# Altium footprint library rescap.PcbLib: 85 footprints (part 5 of 6)
Each footprint in its own frame and in the unit in brackets; x right, y up, seen from the top. Pads: shape width x height; smd on the part's side, far side on the other; paste and mask are expansions set on the pad; w line width, h text height; cw(c..) or ccw(c..) is an arc to the next point about the centre after c.
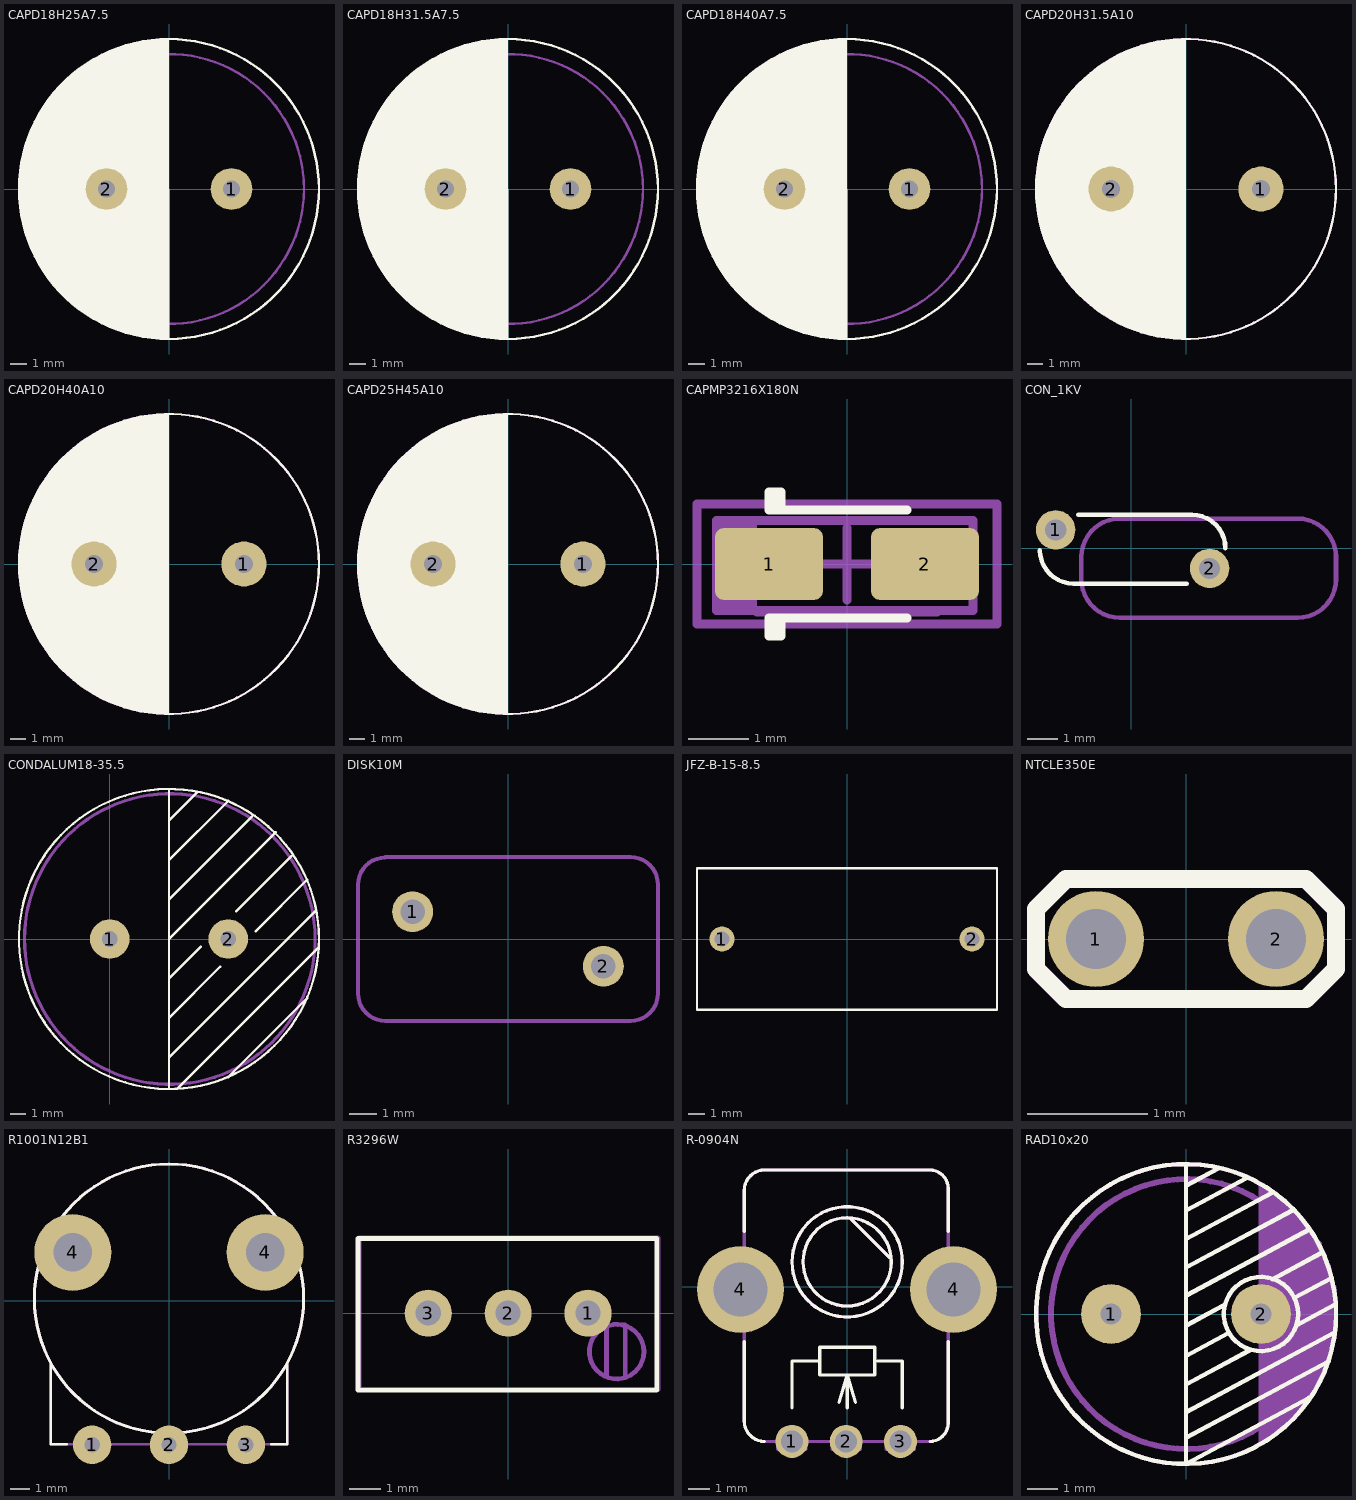
[diagram p4: the footprints below, top view; thin cyan lines are the x and y axes]

## CAPD18H25A7.5 [mm]
height 25
pads (2):
  round 2.5 hole 1: 1(3.75,0) 2(-3.75,0)
Top Overlay:
  circle w0.15: c0,0 r9
  pour cut-out: -3.75,-1.75 -3.922,-1.75 -4.26,-1.683 -4.579,-1.551 -4.866,-1.359 -5.109,-1.116 -5.301,-0.829 -5.433,-0.51 -5.5,-0.172 -5.5,0 -5.5,0.172 -5.433,0.51 -5.301,0.829 -5.109,1.116 -4.866,1.359 -4.579,1.551 -4.26,1.683 -3.922,1.75 -3.75,1.75 -3.578,1.75 -3.24,1.683 -2.921,1.551 -2.634,1.359 -2.391,1.116 -2.199,0.829 -2.067,0.51 -2,0.172 -2,0 -2,-0.172 -2.067,-0.51 -2.199,-0.829 -2.391,-1.116 -2.634,-1.359 -2.921,-1.551 -3.24,-1.683 -3.578,-1.75
  region: 0,-9 -0.442,-9 -1.322,-8.913 -2.189,-8.741 -3.036,-8.484 -3.853,-8.146 -4.633,-7.729 -5.368,-7.238 -6.051,-6.677 -6.677,-6.051 -7.238,-5.368 -7.729,-4.633 -8.146,-3.853 -8.484,-3.036 -8.741,-2.189 -8.913,-1.322 -9,-0.442 -9,0 -9,0.442 -8.913,1.322 -8.741,2.189 -8.484,3.036 -8.146,3.853 -7.729,4.632 -7.238,5.368 -6.677,6.051 -6.051,6.677 -5.368,7.238 -4.633,7.729 -3.853,8.146 -3.036,8.484 -2.189,8.741 -1.322,8.913 -0.442,9 0,9
Mechanical 29:
  circle w0.15: c0,0 r8.1
  lines w0.15: -3.7,-1 -3.7,0 -3.7,1
  text ".Designator" at -2.2,-0.4 h1
3D body: height 25, standoff 0, extent -9,-9 9,9

## CAPD18H31.5A7.5 [mm]
height 25
pads (2):
  round 2.5 hole 1: 1(3.75,0) 2(-3.75,0)
Top Overlay:
  circle w0.15: c0,0 r9
  pour cut-out: -3.75,-1.75 -3.922,-1.75 -4.26,-1.683 -4.579,-1.551 -4.866,-1.359 -5.109,-1.116 -5.301,-0.829 -5.433,-0.51 -5.5,-0.172 -5.5,0 -5.5,0.172 -5.433,0.51 -5.301,0.829 -5.109,1.116 -4.866,1.359 -4.579,1.551 -4.26,1.683 -3.922,1.75 -3.75,1.75 -3.578,1.75 -3.24,1.683 -2.921,1.551 -2.634,1.359 -2.391,1.116 -2.199,0.829 -2.067,0.51 -2,0.172 -2,0 -2,-0.172 -2.067,-0.51 -2.199,-0.829 -2.391,-1.116 -2.634,-1.359 -2.921,-1.551 -3.24,-1.683 -3.578,-1.75
  region: 0,-9 -0.442,-9 -1.322,-8.913 -2.189,-8.741 -3.036,-8.484 -3.853,-8.146 -4.633,-7.729 -5.368,-7.238 -6.051,-6.677 -6.677,-6.051 -7.238,-5.368 -7.729,-4.633 -8.146,-3.853 -8.484,-3.036 -8.741,-2.189 -8.913,-1.322 -9,-0.442 -9,0 -9,0.442 -8.913,1.322 -8.741,2.189 -8.484,3.036 -8.146,3.853 -7.729,4.632 -7.238,5.368 -6.677,6.051 -6.051,6.677 -5.368,7.238 -4.633,7.729 -3.853,8.146 -3.036,8.484 -2.189,8.741 -1.322,8.913 -0.442,9 0,9
Mechanical 29:
  circle w0.15: c0,0 r8.1
  lines w0.15: -3.7,-1 -3.7,0 -3.7,1
  text ".Designator" at -2.2,-0.4 h1
3D body: height 31.5, standoff 0, extent -9,-9 9,9

## CAPD18H40A7.5 [mm]
height 25
pads (2):
  round 2.5 hole 1: 1(3.75,0) 2(-3.75,0)
Top Overlay:
  circle w0.15: c0,0 r9
  pour cut-out: -3.75,-1.75 -3.922,-1.75 -4.26,-1.683 -4.579,-1.551 -4.866,-1.359 -5.109,-1.116 -5.301,-0.829 -5.433,-0.51 -5.5,-0.172 -5.5,0 -5.5,0.172 -5.433,0.51 -5.301,0.829 -5.109,1.116 -4.866,1.359 -4.579,1.551 -4.26,1.683 -3.922,1.75 -3.75,1.75 -3.578,1.75 -3.24,1.683 -2.921,1.551 -2.634,1.359 -2.391,1.116 -2.199,0.829 -2.067,0.51 -2,0.172 -2,0 -2,-0.172 -2.067,-0.51 -2.199,-0.829 -2.391,-1.116 -2.634,-1.359 -2.921,-1.551 -3.24,-1.683 -3.578,-1.75
  region: 0,-9 -0.442,-9 -1.322,-8.913 -2.189,-8.741 -3.036,-8.484 -3.853,-8.146 -4.633,-7.729 -5.368,-7.238 -6.051,-6.677 -6.677,-6.051 -7.238,-5.368 -7.729,-4.633 -8.146,-3.853 -8.484,-3.036 -8.741,-2.189 -8.913,-1.322 -9,-0.442 -9,0 -9,0.442 -8.913,1.322 -8.741,2.189 -8.484,3.036 -8.146,3.853 -7.729,4.632 -7.238,5.368 -6.677,6.051 -6.051,6.677 -5.368,7.238 -4.633,7.729 -3.853,8.146 -3.036,8.484 -2.189,8.741 -1.322,8.913 -0.442,9 0,9
Mechanical 29:
  circle w0.15: c0,0 r8.1
  lines w0.15: -3.7,-1 -3.7,0 -3.7,1
  text ".Designator" at -2.2,-0.4 h1
3D body: height 40, standoff 0, extent -9,-9 9,9

## CAPD20H31.5A10 [mm]
height 31.5
pads (2):
  round 3 hole 1.2: 1(5,0) 2(-5,0)
Top Overlay:
  circle w0.15: c0,0 r10
  pour cut-out: -5,-1.75 -5.172,-1.75 -5.51,-1.683 -5.829,-1.551 -6.116,-1.359 -6.359,-1.116 -6.551,-0.829 -6.683,-0.51 -6.75,-0.172 -6.75,0 -6.75,0.172 -6.683,0.51 -6.551,0.829 -6.359,1.116 -6.116,1.359 -5.829,1.551 -5.51,1.683 -5.172,1.75 -5,1.75 -4.828,1.75 -4.49,1.683 -4.171,1.551 -3.884,1.359 -3.641,1.116 -3.449,0.829 -3.317,0.51 -3.25,0.172 -3.25,0 -3.25,-0.172 -3.317,-0.51 -3.449,-0.829 -3.641,-1.116 -3.884,-1.359 -4.171,-1.551 -4.49,-1.683 -4.828,-1.75
  region: 0,-10 -0.491,-10 -1.469,-9.904 -2.433,-9.712 -3.373,-9.427 -4.281,-9.051 -5.147,-8.588 -5.964,-8.042 -6.724,-7.418 -7.418,-6.724 -8.042,-5.964 -8.588,-5.147 -9.051,-4.281 -9.427,-3.373 -9.712,-2.433 -9.904,-1.469 -10,-0.491 -10,0 -10,0.491 -9.904,1.469 -9.712,2.433 -9.427,3.373 -9.051,4.281 -8.588,5.147 -8.042,5.964 -7.418,6.724 -6.724,7.418 -5.964,8.042 -5.147,8.588 -4.281,9.051 -3.373,9.427 -2.433,9.712 -1.469,9.904 -0.491,10 0,10
Mechanical 29:
  circle w0.15: c0,0 r10.002
  lines w0.15: -6.1,-1 -6.1,0 -6.1,1
  text ".Designator" at -2.6,-0.4 h1
3D body: height 31.5, standoff 0, extent -10,-10 10,10

## CAPD20H40A10 [mm]
height 40
pads (2):
  round 3 hole 1.2: 1(5,0) 2(-5,0)
Top Overlay:
  circle w0.15: c0,0 r10
  region: 0,-10 -0.491,-10 -1.469,-9.904 -2.433,-9.712 -3.373,-9.427 -4.281,-9.051 -5.147,-8.588 -5.964,-8.042 -6.724,-7.418 -7.418,-6.724 -8.042,-5.964 -8.588,-5.147 -9.051,-4.281 -9.427,-3.373 -9.712,-2.433 -9.904,-1.469 -10,-0.491 -10,0 -10,0.491 -9.904,1.469 -9.712,2.433 -9.427,3.373 -9.051,4.281 -8.588,5.147 -8.042,5.964 -7.418,6.724 -6.724,7.418 -5.964,8.042 -5.147,8.588 -4.281,9.051 -3.373,9.427 -2.433,9.712 -1.469,9.904 -0.491,10 0,10
  pour cut-out: -5,-1.75 -5.172,-1.75 -5.51,-1.683 -5.829,-1.551 -6.116,-1.359 -6.359,-1.116 -6.551,-0.829 -6.683,-0.51 -6.75,-0.172 -6.75,0 -6.75,0.172 -6.683,0.51 -6.551,0.829 -6.359,1.116 -6.116,1.359 -5.829,1.551 -5.51,1.683 -5.172,1.75 -5,1.75 -4.828,1.75 -4.49,1.683 -4.171,1.551 -3.884,1.359 -3.641,1.116 -3.449,0.829 -3.317,0.51 -3.25,0.172 -3.25,0 -3.25,-0.172 -3.317,-0.51 -3.449,-0.829 -3.641,-1.116 -3.884,-1.359 -4.171,-1.551 -4.49,-1.683 -4.828,-1.75
Mechanical 29:
  circle w0.15: c0,0 r10.002
  lines w0.15: -6.1,-1 -6.1,0 -6.1,1
  text ".Designator" at -3.3,-0.5 h1
3D body: height 40, standoff 0, extent -10,-10 10,10

## CAPD25H45A10 [mm]
height 45
pads (2):
  round 3 hole 1.2: 1(5,0) 2(-5,0)
Top Overlay:
  circle w0.15: c0,0 r10
  pour cut-out: -5,-1.75 -5.172,-1.75 -5.51,-1.683 -5.829,-1.551 -6.116,-1.359 -6.359,-1.116 -6.551,-0.829 -6.683,-0.51 -6.75,-0.172 -6.75,0 -6.75,0.172 -6.683,0.51 -6.551,0.829 -6.359,1.116 -6.116,1.359 -5.829,1.551 -5.51,1.683 -5.172,1.75 -5,1.75 -4.828,1.75 -4.49,1.683 -4.171,1.551 -3.884,1.359 -3.641,1.116 -3.449,0.829 -3.317,0.51 -3.25,0.172 -3.25,0 -3.25,-0.172 -3.317,-0.51 -3.449,-0.829 -3.641,-1.116 -3.884,-1.359 -4.171,-1.551 -4.49,-1.683 -4.828,-1.75
  region: 0,-10 -0.491,-10 -1.469,-9.904 -2.433,-9.712 -3.373,-9.427 -4.281,-9.051 -5.147,-8.588 -5.964,-8.042 -6.724,-7.418 -7.418,-6.724 -8.042,-5.964 -8.588,-5.147 -9.051,-4.281 -9.427,-3.373 -9.712,-2.433 -9.904,-1.469 -10,-0.491 -10,0 -10,0.491 -9.904,1.469 -9.712,2.433 -9.427,3.373 -9.051,4.281 -8.588,5.147 -8.042,5.964 -7.418,6.724 -6.724,7.418 -5.964,8.042 -5.147,8.588 -4.281,9.051 -3.373,9.427 -2.433,9.712 -1.469,9.904 -0.491,10 0,10
Mechanical 29:
  circle w0.15: c0,0 r10.002
  lines w0.15: -6.1,-1 -6.1,0 -6.1,1
  text ".Designator" at -3.8,-0.3 h1
3D body: height 45, standoff 0, extent -10,-10 10,10

## CAPMP3216X180N [mm] "Capacitor, polarized, Molded Body, EIA 535BAAC size A; 3.20mm L X 1.60mm W X 1.80mm H"
height 1.8
pads (2):
  rrect25% 1.8x1.2 smd: 1(-1.3,0) 2(1.3,0)
Top Overlay:
  lines w0.15: -1.2,-1.2 -1.2,-0.9 ; -1.2,0.9 -1.2,1.2 ; -1.1,-0.9 -1.1,-1.2 -1.3,-1.2 -1.3,-0.9 1,-0.9 ; -1.1,0.9 -1.1,1.2 -1.3,1.2 -1.3,0.9 1,0.9
Top Courtyard:
  lines w0.15: -0.6,0 0,0 ; 0,-0.6 0,0 ; 0,0.6 0,0 ; 0.6,0 0,0 ; -2.5,-1 -2.5,1 2.5,1 2.5,-1 -2.5,-1
Mechanical 29:
  rectangle: -2.175,-0.775 -1.5,0.725
  lines w0.15: -1.5,-0.8 1.5,-0.8 ; -2.175,-0.775 2.1,-0.775 2.1,0.725 -2.175,0.725 -2.175,-0.775
  text ".Designator" at -1.4,-0.4 h1
3D body "CAPMP3216X180N.STEP": height 1.8, standoff 0, extent -1.6,-0.8 1.6,0.8

## CON_1KV [mm]
pads (2):
  round 1.3 hole 0.7: 1(-2.5,0.6) 2(2.58,-0.67)
Top Overlay:
  lines w0.15: -3.02,-0.07 ccw(c-1.92,-0.07) -1.92,-1.17 1.83,-1.17 ; -1.75,1.1 2,1.1 cw(c2,0) 3.1,0
Mechanical 29:
  lines w0.15: -1.65,-1.03 ccw(c-0.38,-1.03) -0.38,-2.3 -0.15,-2.3 5.48,-2.3 ccw(c5.48,-1.03) 6.75,-1.03 6.75,-0.295 ccw(c5.48,-0.295) 5.48,0.975 -0.38,0.975 ccw(c-0.38,-0.295) -1.65,-0.295 -1.65,-1.03
  text ".Designator" at -0.2,-0.9 h1
3D body "CAPS6mm.STEP": height 6.1, standoff -3, extent -2.775,-0.95 2.825,0.85

## CONDALUM18-35.5 [mm]
pads (2):
  round 2.5 hole 1: 1(0,0) 2(7.5,0)
Top Overlay:
  circle w0.15: c3.75,0 r9.5
  lines w0.15: 3.75,-9.5 3.75,9.5 ; 3.75,-7.5 13,1.75 ; 3.75,-5 7,-1.75 ; 3.75,-2.5 5.75,-0.5 ; 3.75,0 10.5,6.75 ; 3.75,2.5 9,7.75 ; 3.75,5 7.5,8.75 ; 3.75,7.5 5.5,9.25 ; 4.25,-9.5 13.25,-0.5 ; 7.5,-8.75 12.5,-3.75 ; 8,1.75 11.5,5.25 ; 9.25,0.5 12.5,3.75
Top Courtyard:
  circle w0.2: c3.8,0 r9.202
3D body "cap.STEP": height 35.55, standoff -3.1, extent -6.699,-10.41 14.202,10.448

## DISK10M [mm]
pads (2):
  round 1.5 hole 0.9: 1(-3.5,1) 2(3.5,-1)
Top Courtyard:
  lines w0.15: -5.5,-2 ccw(c-4.5,-2) -4.5,-3 4.5,-3 ccw(c4.5,-2) 5.5,-2 ; -5.5,-1.989 -5.5,2 ; -5.5,1.989 cw(c-4.5,1.989) -4.5,2.989 ; -4.5,3 4.5,3 cw(c4.5,2) 5.5,2 ; 5.5,-1.989 5.5,1.989

## JFZ-B-15-8.5 [mm]
pads (2):
  round 1.5 hole 0.9: 1(-7.5,0) 2(7.5,0)
Top Overlay:
  lines w0.15: -9,-4.25 -9,4.25 -7.5,4.25 7.5,4.25 9,4.25 9,-4.25 7.5,-4.25 -7.5,-4.25 -9,-4.25
3D body: height 14, standoff 0.5, extent -9,-4.3 9,4.2

## NTCLE350E [mm]
pads (2):
  round 0.8 hole 0.5: 1(-0.75,0) 2(0.75,0)
Top Overlay:
  lines w0.15: -1.25,-0.25 -1,-0.5 1,-0.5 1.25,-0.25 1.25,0.25 1,0.5 -1,0.5 -1.25,0.25 -1.25,-0.25
Top Courtyard:
  lines w0.15: -1.25,-0.25 -1,-0.5 1,-0.5 1.25,-0.25 1.25,0.25 1,0.5 -1,0.5 -1.25,0.25 -1.25,-0.25

## R1001N12B1 [mm]
pads (5):
  round 2 hole 0.8: 1(-4,-7.5) 2(0,-7.5) 3(4,-7.5)
  round 4 hole 2: 4(-5,2.5) 4(5,2.5)
Top Overlay:
  circle w0.15: c0,0.1 r7
  lines w0.15: -6.15,-3.25 -6.15,-7.475 -5.325,-7.475 ; 5.325,-7.475 6.15,-7.475 6.15,-3.25
Mechanical 29:
  circle w0.15: c0,0.1 r7
  lines w0.15: -6.15,-3.25 -6.15,-7.475 6.15,-7.475 6.15,-3.25
  text ".Designator" at -2.6,-0.1 h1
3D body "R1001N12B1.STEP": height 2.4, standoff -2.4, extent -7,-7.5 7,7.1

## R3296W [mm]
height 13
pads (3):
  round 1.5 hole 0.8: 1(2.54,0) 2(0,0) 3(-2.54,0)
Top Overlay:
  lines w0.15: -4.775,-2.45 -4.775,2.375 4.725,2.375 4.725,-2.45 -4.775,-2.45
Mechanical 29:
  circle w0.15: c3.45,-1.225 r0.868
  lines w0.15: 3.125,-2 3.125,-0.375 3.2,-0.375 ; 3.675,-0.375 3.725,-0.375 3.725,-2.05 ; -4.735,-2.43 -4.735,2.395 4.765,2.395 4.765,-2.43 -4.735,-2.43
  text ".Designator" at -3.3,-0.1 h1
3D body "3296W.STEP": height 11.52, standoff -3, extent -4.765,-2.43 4.765,2.4

## R-0904N [mil] "пїЅпїЅпїЅпїЅпїЅпїЅпїЅпїЅпїЅпїЅ пїЅпїЅпїЅпїЅпїЅпїЅпїЅпїЅ"
height 1377.95
pads (5):
  round 60 hole 40: 1(-100.28,-280.59) 2(-1.85,-280.59) 3(96.57,-280.59)
  round 157.48 hole 98.43: 4(-193.7,-5)
  round 157.48 hole 98.42: 4(193,-5)
Top Overlay:
  circle w5.91: c0,45 r80
  circle w5.91: c0,45 r100
  lines w5.91: -186.89,-100 -186.89,-243.7 ccw(c-150,-243.7) -150,-280.59 ; -186.89,100 -186.89,175 ; -186.89,174.65 cw(c-150,174.65) -150,211.54 150,211.54 cw(c150,178.35) 183.19,178.35 183.19,100 ; -100,-220 -100,-135 -50,-135 ; -15,-210 0,-160 ; 0,-220 0,-160 ; 7.5,122.5 77.5,52.5 ; 15,-210 0,-160 ; 55,-135 100,-135 100,-198.75 100,-220 ; 150,-280.59 ccw(c150,-247.4) 183.19,-247.4 183.19,-100 ; -50,-160 -50,-110 50,-110 50,-160 -50,-160
Mechanical 29:
  circle w5.91: c0,45 r80
  circle w5.91: c0,45 r100
  lines w5.91: -186.89,-59.06 -201.57,-59.06 -224.17,-59.06 -224.17,47.24 -186.89,47.24 ; -186.89,174.65 cw(c-150,174.65) -150,211.54 150,211.54 cw(c150,178.35) 183.19,178.35 183.19,-100 183.19,-247.4 cw(c150,-247.4) 150,-280.59 -150,-280.59 cw(c-150,-243.7) -186.89,-243.7 -186.89,-100 -186.89,175 ; -125.98,-280.59 -125.98,-295.28 -74.8,-295.28 -74.8,-280.59 ; -27.56,-280.59 -27.56,-295.28 23.62,-295.28 23.62,-280.59 ; 7.5,122.5 77.5,52.5 ; 70.87,-280.59 70.87,-295.28 122.05,-295.28 122.05,-280.59 ; 183.19,-59.06 197.87,-59.06 220.47,-59.06 220.47,47.24 183.19,47.24
  text ".Designator" at -145.67,-173.23 h39.37
3D body "Potenciometr.stp": height 1267.72, standoff -181.1, extent -209.37,-290 208.61,242.01

## RAD10x20 [mm]
height 20
pads (2):
  round 2 hole 0.7: 1(-2.5,0) 2(2.5,0)
Top Overlay:
  circle w0.15: c2.5,0 r1.237
  circle w0.15: c0,0 r5
  lines w0.15: 0,-4.125 4.751,-1.576 ; 0,-3.275 4.949,-0.62 ; 0,-2.35 2.128,-1.208 ; 0,-1.4 1.417,-0.639 ; 0,1.55 3.557,3.459 ; 0,2.5 2.859,4.034 ; 0,3.45 2.02,4.534 ; 0,4.275 1.076,4.852 ; 0,5 0,-5 4.1,-2.8 ; 0.025,-0.375 1.246,0.28 ; 0.025,0.625 4.125,2.825 ; 2.875,1.154 4.498,2.025 ; 3.6,0.532 4.859,1.207 ; 3.675,-0.378 4.968,0.316
Top Courtyard:
  circle w0.2: c0,0 r4.5
Mechanical 29:
  circle w0.15: c0,0 r5
  region: 2.425,4.4 2.425,-4.35 2.475,-4.35 2.8,-4.025 3,-4.025 3.65,-3.375 3.65,-3.325 3.7,-3.325 4.05,-2.975 4.05,-2.85 4.375,-2.525 4.375,-2.275 4.6,-2.05 4.6,-1.825 4.775,-1.65 4.775,-1.175 4.95,-1 4.95,-0.15 5,-0.1 5,0.925 4.825,1.1 4.825,1.625 4.525,1.925 4.525,2.375 3.9,3 3.9,3.175 3.225,3.85
  text ".Designator" at -3.9,-0.3 h1
3D body "cap5mm.STEP": height 15.1, standoff -2.4, extent -4.525,-4.475 4.485,4.525